# Altium footprint library LukaLIBRARY.PcbLib: 784 footprints (part 42 of 49)
Each footprint in its own frame and in the unit in brackets; x right, y up, seen from the top. Pads: shape width x height; smd on the part's side, far side on the other; paste and mask are expansions set on the pad; w line width, h text height; cw(c..) or ccw(c..) is an arc to the next point about the centre after c.
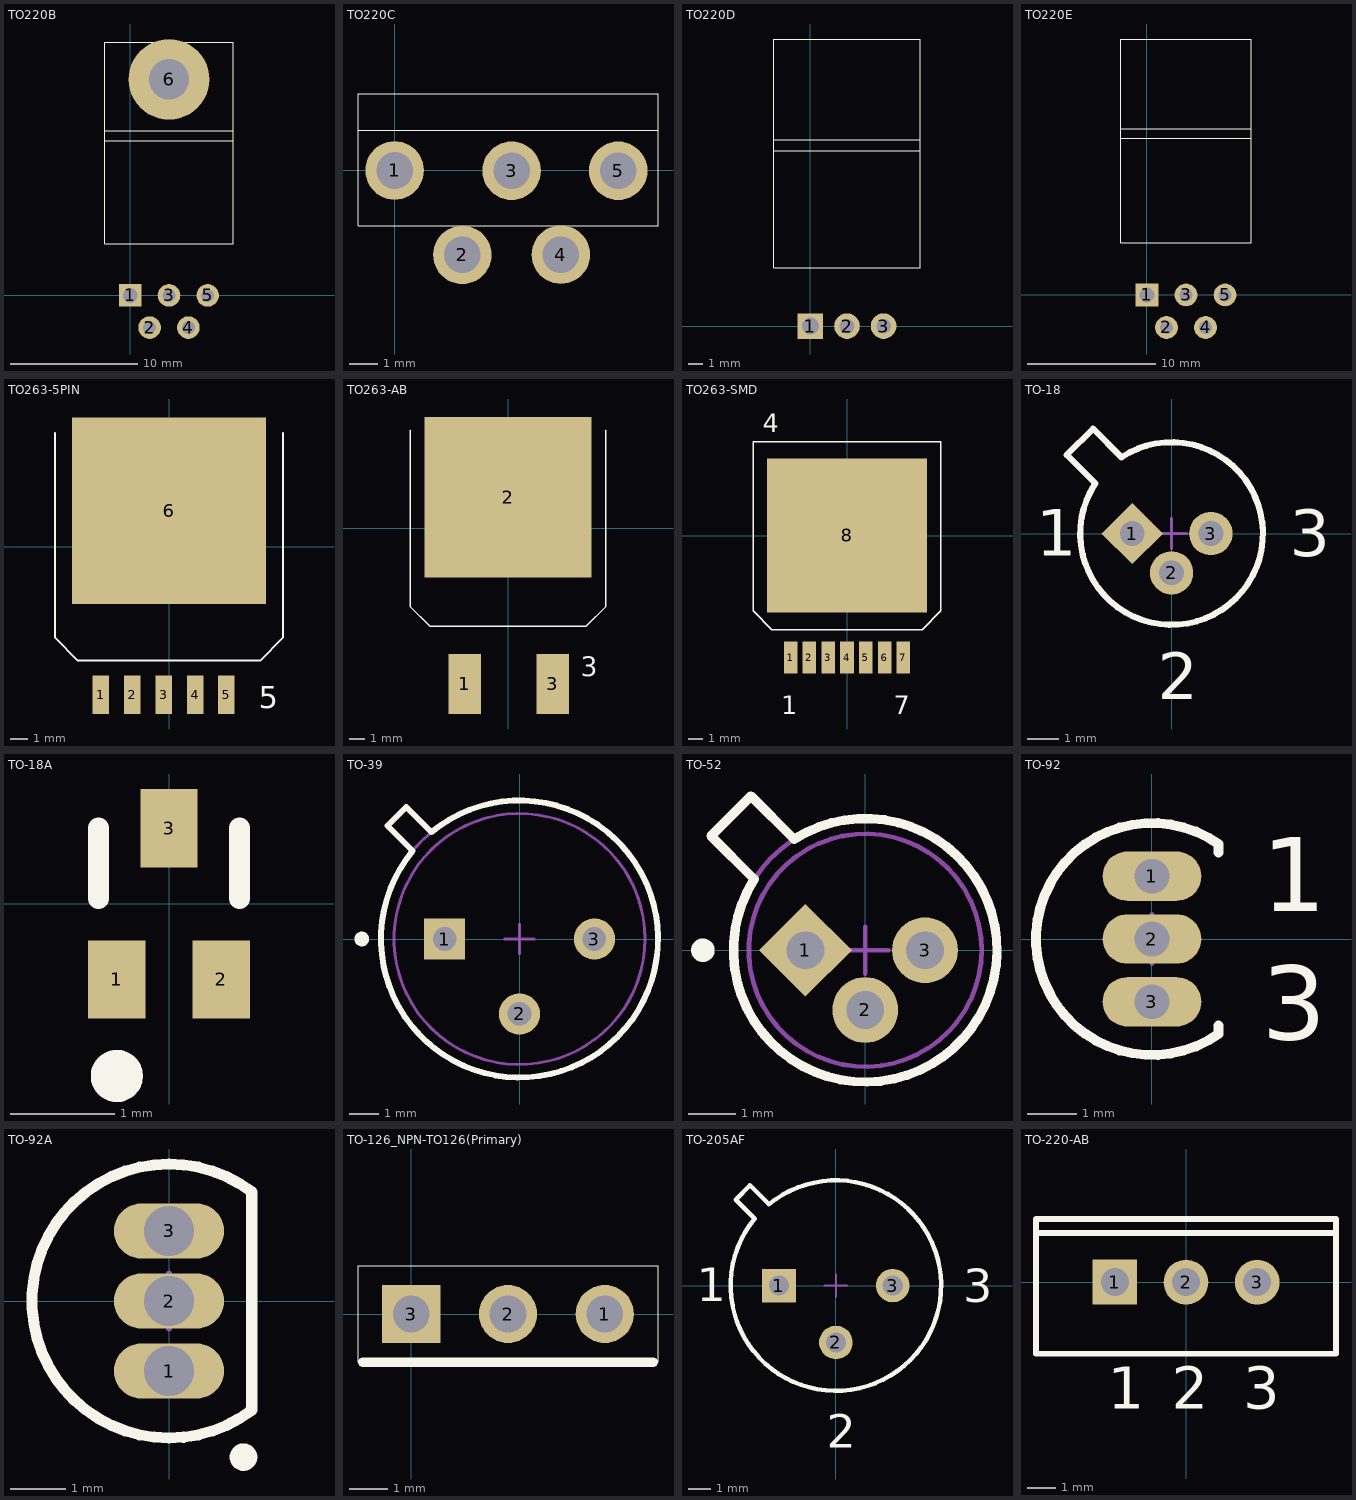
[diagram p41: the footprints below, top view; thin cyan lines are the x and y axes]

## TO220B [mil]
pads (6):
  rect 70x70 hole 46: 1(0,0)
  round 70 hole 40 mask-1000: 2(60,-100) 3(120,0) 4(180,-100) 5(240,0)
  round 250 hole 125: 6(120,670)
Top Overlay:
  lines w1: -80,480 320,480 ; -80,510 320,510 ; -80,160 -80,785 320,785 320,160 -80,160
Top Solder:
  region: 60,-64.7 50.86,-65.9 42.35,-69.43 35.04,-75.04 29.43,-82.35 25.9,-90.86 24.7,-100 25.9,-109.14 29.43,-117.65 35.04,-124.96 42.35,-130.57 50.86,-134.1 60,-135.3 69.14,-134.1 77.65,-130.57 84.96,-124.96 90.57,-117.65 94.1,-109.14 95.3,-100 94.1,-90.86 90.57,-82.35 84.96,-75.04 77.65,-69.43 69.14,-65.9
  region: 180,-64.7 170.86,-65.9 162.35,-69.43 155.04,-75.04 149.43,-82.35 145.9,-90.86 144.7,-100 145.9,-109.14 149.43,-117.65 155.04,-124.96 162.35,-130.57 170.86,-134.1 180,-135.3 189.14,-134.1 197.65,-130.57 204.96,-124.96 210.57,-117.65 214.1,-109.14 215.3,-100 214.1,-90.86 210.57,-82.35 204.96,-75.04 197.65,-69.43 189.14,-65.9
  region: 240,35.3 230.86,34.1 222.35,30.57 215.04,24.96 209.43,17.65 205.9,9.14 204.7,0 205.9,-9.14 209.43,-17.65 215.04,-24.96 222.35,-30.57 230.86,-34.1 240,-35.3 249.14,-34.1 257.65,-30.57 264.96,-24.96 270.57,-17.65 274.1,-9.14 275.3,0 274.1,9.14 270.57,17.65 264.96,24.96 257.65,30.57 249.14,34.1
  region: 120,35.3 110.86,34.1 102.35,30.57 95.04,24.96 89.43,17.65 85.9,9.14 84.7,0 85.9,-9.14 89.43,-17.65 95.04,-24.96 102.35,-30.57 110.86,-34.1 120,-35.3 129.14,-34.1 137.65,-30.57 144.96,-24.96 150.57,-17.65 154.1,-9.14 155.3,0 154.1,9.14 150.57,17.65 144.96,24.96 137.65,30.57 129.14,34.1
Bottom Solder:
  region: 60,-64.7 50.86,-65.9 42.35,-69.43 35.04,-75.04 29.43,-82.35 25.9,-90.86 24.7,-100 25.9,-109.14 29.43,-117.65 35.04,-124.96 42.35,-130.57 50.86,-134.1 60,-135.3 69.14,-134.1 77.65,-130.57 84.96,-124.96 90.57,-117.65 94.1,-109.14 95.3,-100 94.1,-90.86 90.57,-82.35 84.96,-75.04 77.65,-69.43 69.14,-65.9
  region: 180,-64.7 170.86,-65.9 162.35,-69.43 155.04,-75.04 149.43,-82.35 145.9,-90.86 144.7,-100 145.9,-109.14 149.43,-117.65 155.04,-124.96 162.35,-130.57 170.86,-134.1 180,-135.3 189.14,-134.1 197.65,-130.57 204.96,-124.96 210.57,-117.65 214.1,-109.14 215.3,-100 214.1,-90.86 210.57,-82.35 204.96,-75.04 197.65,-69.43 189.14,-65.9
  region: 240,35.3 230.86,34.1 222.35,30.57 215.04,24.96 209.43,17.65 205.9,9.14 204.7,0 205.9,-9.14 209.43,-17.65 215.04,-24.96 222.35,-30.57 230.86,-34.1 240,-35.3 249.14,-34.1 257.65,-30.57 264.96,-24.96 270.57,-17.65 274.1,-9.14 275.3,0 274.1,9.14 270.57,17.65 264.96,24.96 257.65,30.57 249.14,34.1
  region: 120,35.3 110.86,34.1 102.35,30.57 95.04,24.96 89.43,17.65 85.9,9.14 84.7,0 85.9,-9.14 89.43,-17.65 95.04,-24.96 102.35,-30.57 110.86,-34.1 120,-35.3 129.14,-34.1 137.65,-30.57 144.96,-24.96 150.57,-17.65 154.1,-9.14 155.3,0 154.1,9.14 150.57,17.65 144.96,24.96 137.65,30.57 129.14,34.1

## TO220C [mil]
pads (5):
  round 80 hole 50: 1(0,-0.39) 2(92.52,-115.75) 3(159.76,-0.79) 4(227.17,-115.35) 5(305.51,-0.79)
Top Overlay:
  lines w1: -50,54.33 359.76,54.21 ; -50,-75.98 -50,104.33 359.76,104.21 359.76,-75.79 -50,-75.98

## TO220D [mil]
pads (3):
  rect 70x70 hole 46: 1(0,0)
  round 70 hole 40 mask-1000: 2(100,0) 3(200,0)
Top Overlay:
  lines w1: -100,480 300,480 ; -100,510 300,510 ; -100,160 -100,785 300,785 300,160 -100,160
Top Solder:
  region: 200,35.3 190.86,34.1 182.35,30.57 175.04,24.96 169.43,17.65 165.9,9.14 164.7,0 165.9,-9.14 169.43,-17.65 175.04,-24.96 182.35,-30.57 190.86,-34.1 200,-35.3 209.14,-34.1 217.65,-30.57 224.96,-24.96 230.57,-17.65 234.1,-9.14 235.3,0 234.1,9.14 230.57,17.65 224.96,24.96 217.65,30.57 209.14,34.1
  region: 100,35.3 90.86,34.1 82.35,30.57 75.04,24.96 69.43,17.65 65.9,9.14 64.7,0 65.9,-9.14 69.43,-17.65 75.04,-24.96 82.35,-30.57 90.86,-34.1 100,-35.3 109.14,-34.1 117.65,-30.57 124.96,-24.96 130.57,-17.65 134.1,-9.14 135.3,0 134.1,9.14 130.57,17.65 124.96,24.96 117.65,30.57 109.14,34.1
Bottom Solder:
  region: 200,35.3 190.86,34.1 182.35,30.57 175.04,24.96 169.43,17.65 165.9,9.14 164.7,0 165.9,-9.14 169.43,-17.65 175.04,-24.96 182.35,-30.57 190.86,-34.1 200,-35.3 209.14,-34.1 217.65,-30.57 224.96,-24.96 230.57,-17.65 234.1,-9.14 235.3,0 234.1,9.14 230.57,17.65 224.96,24.96 217.65,30.57 209.14,34.1
  region: 100,35.3 90.86,34.1 82.35,30.57 75.04,24.96 69.43,17.65 65.9,9.14 64.7,0 65.9,-9.14 69.43,-17.65 75.04,-24.96 82.35,-30.57 90.86,-34.1 100,-35.3 109.14,-34.1 117.65,-30.57 124.96,-24.96 130.57,-17.65 134.1,-9.14 135.3,0 134.1,9.14 130.57,17.65 124.96,24.96 117.65,30.57 109.14,34.1

## TO220E [mil]
pads (5):
  rect 70x70 hole 46: 1(0,0)
  round 70 hole 40 mask-1000: 2(60,-100) 3(120,0) 4(180,-100) 5(240,0)
Top Overlay:
  lines w1: -80,480 320,480 ; -80,510 320,510 ; -80,160 -80,785 320,785 320,160 -80,160
Top Solder:
  region: 60,-64.7 50.86,-65.9 42.35,-69.43 35.04,-75.04 29.43,-82.35 25.9,-90.86 24.7,-100 25.9,-109.14 29.43,-117.65 35.04,-124.96 42.35,-130.57 50.86,-134.1 60,-135.3 69.14,-134.1 77.65,-130.57 84.96,-124.96 90.57,-117.65 94.1,-109.14 95.3,-100 94.1,-90.86 90.57,-82.35 84.96,-75.04 77.65,-69.43 69.14,-65.9
  region: 120,35.3 110.86,34.1 102.35,30.57 95.04,24.96 89.43,17.65 85.9,9.14 84.7,0 85.9,-9.14 89.43,-17.65 95.04,-24.96 102.35,-30.57 110.86,-34.1 120,-35.3 129.14,-34.1 137.65,-30.57 144.96,-24.96 150.57,-17.65 154.1,-9.14 155.3,0 154.1,9.14 150.57,17.65 144.96,24.96 137.65,30.57 129.14,34.1
  region: 180,-64.7 170.86,-65.9 162.35,-69.43 155.04,-75.04 149.43,-82.35 145.9,-90.86 144.7,-100 145.9,-109.14 149.43,-117.65 155.04,-124.96 162.35,-130.57 170.86,-134.1 180,-135.3 189.14,-134.1 197.65,-130.57 204.96,-124.96 210.57,-117.65 214.1,-109.14 215.3,-100 214.1,-90.86 210.57,-82.35 204.96,-75.04 197.65,-69.43 189.14,-65.9
  region: 240,35.3 230.86,34.1 222.35,30.57 215.04,24.96 209.43,17.65 205.9,9.14 204.7,0 205.9,-9.14 209.43,-17.65 215.04,-24.96 222.35,-30.57 230.86,-34.1 240,-35.3 249.14,-34.1 257.65,-30.57 264.96,-24.96 270.57,-17.65 274.1,-9.14 275.3,0 274.1,9.14 270.57,17.65 264.96,24.96 257.65,30.57 249.14,34.1
Bottom Solder:
  region: 60,-64.7 50.86,-65.9 42.35,-69.43 35.04,-75.04 29.43,-82.35 25.9,-90.86 24.7,-100 25.9,-109.14 29.43,-117.65 35.04,-124.96 42.35,-130.57 50.86,-134.1 60,-135.3 69.14,-134.1 77.65,-130.57 84.96,-124.96 90.57,-117.65 94.1,-109.14 95.3,-100 94.1,-90.86 90.57,-82.35 84.96,-75.04 77.65,-69.43 69.14,-65.9
  region: 120,35.3 110.86,34.1 102.35,30.57 95.04,24.96 89.43,17.65 85.9,9.14 84.7,0 85.9,-9.14 89.43,-17.65 95.04,-24.96 102.35,-30.57 110.86,-34.1 120,-35.3 129.14,-34.1 137.65,-30.57 144.96,-24.96 150.57,-17.65 154.1,-9.14 155.3,0 154.1,9.14 150.57,17.65 144.96,24.96 137.65,30.57 129.14,34.1
  region: 180,-64.7 170.86,-65.9 162.35,-69.43 155.04,-75.04 149.43,-82.35 145.9,-90.86 144.7,-100 145.9,-109.14 149.43,-117.65 155.04,-124.96 162.35,-130.57 170.86,-134.1 180,-135.3 189.14,-134.1 197.65,-130.57 204.96,-124.96 210.57,-117.65 214.1,-109.14 215.3,-100 214.1,-90.86 210.57,-82.35 204.96,-75.04 197.65,-69.43 189.14,-65.9
  region: 240,35.3 230.86,34.1 222.35,30.57 215.04,24.96 209.43,17.65 205.9,9.14 204.7,0 205.9,-9.14 209.43,-17.65 215.04,-24.96 222.35,-30.57 230.86,-34.1 240,-35.3 249.14,-34.1 257.65,-30.57 264.96,-24.96 270.57,-17.65 274.1,-9.14 275.3,0 274.1,9.14 270.57,17.65 264.96,24.96 257.65,30.57 249.14,34.1

## TO263-5PIN [mm]
pads (6):
  rect 0.914x2.159 smd mask-25.4: 1(-3.8,-8.25) 2(-2.04,-8.25) 3(-0.3,-8.25) 4(1.46,-8.25) 5(3.2,-8.25)
  rect 10.795x10.414 smd mask-25.4: 6(0,2)
Top Overlay:
  lines w0.1: -6.35,6.35 -6.35,-5.08 -5.08,-6.35 5.08,-6.35 6.35,-5.08 6.35,6.35
  text "5" at 5,-9 h1.25
Top Solder:
  region: -5.397,-3.207 5.397,-3.207 5.397,7.207 -5.397,7.207
  region: -0.757,-9.329 0.157,-9.329 0.157,-7.17 -0.757,-7.17
  region: 2.743,-9.329 3.657,-9.329 3.657,-7.17 2.743,-7.17
  region: 1.003,-9.329 1.917,-9.329 1.917,-7.17 1.003,-7.17
  region: -2.497,-9.329 -1.583,-9.329 -1.583,-7.17 -2.497,-7.17
  region: -4.257,-9.329 -3.343,-9.329 -3.343,-7.17 -4.257,-7.17

## TO263-AB [mm]
pads (3):
  rect 2.1x3.9 smd: 1(-2.8,-10.1) 3(2.9,-10.1)
  rect 10.795x10.414 smd mask-25.4: 2(0,2)
Top Overlay:
  lines w0.1: -6.35,6.35 -6.35,-5.08 -5.08,-6.35 5.08,-6.35 6.35,-5.08 6.35,6.35
  text "3" at 4.7,-9.6 h1.25
Top Solder:
  region: -5.397,-3.207 5.397,-3.207 5.397,7.207 -5.397,7.207

## TO263-SMD [mil]
pads (8):
  rect 36x85 smd mask-1000: 1(-150,-325) 2(-100,-325) 3(-50,-325) 4(0,-325) 5(50,-325) 6(100,-325) 7(150,-325)
  rect 425x410 smd mask-1000: 8(0,1)
Top Overlay:
  lines w3.94: -250,-200 -250,250 250,250 250,-200 200,-250 -200,-250 -250,-200
  text "7" at 125,-475 h49.21
  text "1" at -175,-475 h49.21
  text "4" at -225,275 h49.21
Top Solder:
  region: -212.5,-204 212.5,-204 212.5,206 -212.5,206
  region: 132,-367.5 168,-367.5 168,-282.5 132,-282.5
  region: -168,-367.5 -132,-367.5 -132,-282.5 -168,-282.5
  region: 82,-367.5 118,-367.5 118,-282.5 82,-282.5
  region: 32,-367.5 68,-367.5 68,-282.5 32,-282.5
  region: -18,-367.5 18,-367.5 18,-282.5 -18,-282.5
  region: -68,-367.5 -32,-367.5 -32,-282.5 -68,-282.5
  region: -118,-367.5 -82,-367.5 -82,-282.5 -118,-282.5

## TO-18 [mm] "Can; 3 Leads; Pin Circle Dia. 2.54 mm; Lead Dia. 0.48 mm (max)"
height 5.33
pads (3):
  rect 1.4x1.4 hole 0.8 rot 45: 1(-1.27,0)
  round 1.4 hole 0.8: 2(0,-1.27) 3(1.27,0)
Top Overlay:
  lines w0.2: -3.386,2.537 -2.537,3.386 -1.618,2.467 cw(c0,0) -2.467,1.618 -3.386,2.537
  text "1" at -4.38,-0.719 h1.5
  text "2" at -0.443,-5.355 h1.5
  text "3" at 3.812,-0.742 h1.5
Mechanical 15:
  lines w0.1: -0.5,0 0.5,0 ; 0,-0.5 0,0.5

## TO-18A [mm] "SC-89; 3 Flat Leads; Body 1.6 x 1.6 x 0.7 mm, inc leads (LxWxH typ)"
height 0.8
pads (3):
  rect 0.55x0.75 smd: 1(-0.5,-0.725) 2(0.5,-0.725) 3(0,0.725)
Top Overlay:
  circle w0.25: c-0.5,-1.65 r0.125
  lines w0.2: -0.676,0.05 -0.676,0.725 ; 0.675,0.05 0.675,0.725

## TO-39 [mm] "Can; 3 Leads; Pin Circle Dia. 5.08 mm; Lead Dia. 0.48 mm (max)"
height 4.55
pads (3):
  rect 1.4x1.4 hole 0.8: 1(-2.54,0)
  round 1.4 hole 0.8: 2(0,-2.54) 3(2.54,0)
Top Overlay:
  circle w0.25: c-5.35,0 r0.125
  lines w0.2: -3.626,2.99 -4.475,3.838 -3.838,4.475 -2.99,3.626 ; -3.622,2.987 ccw(c0,0) -2.987,3.622
Mechanical 13:
  circle w0.1: c0,0 r4.695
  circle w0.1: c0,0 r4.255
Mechanical 15:
  lines w0.1: -0.5,0 0.5,0 ; 0,-0.5 0,0.5
3D body: height 1.27, standoff 0, extent -4.705,-4.705 4.705,4.705
3D body: height 4.55, standoff 1.27, extent -4.264,-4.264 4.264,4.264

## TO-52 [mm] "Can; 3 Leads; Pin Circle Dia. 2.54 mm; Lead Dia. 0.48 mm (max)"
height 2.67
pads (3):
  rect 1.4x1.4 hole 0.8 rot 45: 1(-1.27,0)
  round 1.4 hole 0.8: 2(0,-1.27) 3(1.27,0)
Top Overlay:
  circle w0.25: c-3.45,0 r0.125
  lines w0.2: -3.277,2.429 -2.429,3.277 -1.51,2.358 cw(c0,0) -2.358,1.51 -3.277,2.429
Mechanical 13:
  circle w0.1: c0,0 r2.475
  circle w0.1: c0,0 r2.8
Mechanical 15:
  lines w0.1: -0.5,0 0.5,0 ; 0,-0.5 0,0.5
3D body: height 2.67, standoff 0.76, extent -2.486,-2.486 2.486,2.486
3D body: height 0.76, standoff 0, extent -2.808,-2.808 2.808,2.808

## TO-92 [mm] "TO, Flat Index; 3 In-Line, Axial Leads; Body Dia. 4.6mm; Leads 0.41 x 0.39 mm (max)"
height 4.7
pads (3):
  oval 2x1 hole 0.7: 1(0,1.27) 2(0,0) 3(0,-1.27)
Top Overlay:
  lines w0.2: 1.35,-1.75 1.35,-1.92 cw(c0,0) 1.35,1.92 1.35,1.75
  text "3" at 2.224,-2.035 h1.5
  text "1" at 2.224,0.56 h1.5
Mechanical 15:
  lines w0.1: -0.5,0 0.5,0 ; 0,-0.5 0,0.5

## TO-92A [mm] "TO, Flat Index; 3 In-Line, Axial Leads; Body Dia. 4.5mm; Leads 0.51 x 0.48 mm (max)"
height 6.86
pads (3):
  oval 2x1 hole 0.9: 1(0,-1.27) 2(0,0) 3(0,1.27)
Top Overlay:
  circle w0.25: c1.35,-2.83 r0.125
  lines w0.2: 1.5,-1.98 cw(c0,0) 1.5,1.98 1.5,-1.98
Mechanical 13:
  lines w0.1: 1.5,-1.98 cw(c0,0) 1.5,1.98 1.5,-1.98
Mechanical 15:
  lines w0.1: -0.5,0 0.5,0 ; 0,-0.5 0,0.5
3D body: height 6.86, standoff 2.2, extent -2.497,-2.497 1.501,2.497

## TO-126_NPN-TO126(Primary) [mil]
pads (3):
  round 60 hole 38 mask-1000: 1(200,0) 2(100,0)
  rect 60x60 hole 38 mask-1000: 3(0,0)
Top Overlay:
  lines w1: -55,-50 -55,50 255,50 255,-50
  lines w10: -50,-50 250,-50
Top Solder:
  region: -30,-30 30,-30 30,30 -30,30
  region: 200,30.26 192.17,29.23 184.87,26.2 178.6,21.4 173.79,15.13 170.77,7.83 169.74,0 170.77,-7.83 173.79,-15.13 178.6,-21.4 184.87,-26.2 192.17,-29.23 200,-30.26 207.83,-29.23 215.13,-26.2 221.4,-21.4 226.21,-15.13 229.23,-7.83 230.26,0 229.23,7.83 226.21,15.13 221.4,21.4 215.13,26.2 207.83,29.23
  region: 100,30.26 92.17,29.23 84.87,26.2 78.6,21.4 73.8,15.13 70.77,7.83 69.74,0 70.77,-7.83 73.8,-15.13 78.6,-21.4 84.87,-26.2 92.17,-29.23 100,-30.26 107.83,-29.23 115.13,-26.2 121.4,-21.4 126.2,-15.13 129.23,-7.83 130.26,0 129.23,7.83 126.2,15.13 121.4,21.4 115.13,26.2 107.83,29.23
Bottom Solder:
  region: -30,-30 30,-30 30,30 -30,30
  region: 200,30.26 192.17,29.23 184.87,26.2 178.6,21.4 173.79,15.13 170.77,7.83 169.74,0 170.77,-7.83 173.79,-15.13 178.6,-21.4 184.87,-26.2 192.17,-29.23 200,-30.26 207.83,-29.23 215.13,-26.2 221.4,-21.4 226.21,-15.13 229.23,-7.83 230.26,0 229.23,7.83 226.21,15.13 221.4,21.4 215.13,26.2 207.83,29.23
  region: 100,30.26 92.17,29.23 84.87,26.2 78.6,21.4 73.8,15.13 70.77,7.83 69.74,0 70.77,-7.83 73.8,-15.13 78.6,-21.4 84.87,-26.2 92.17,-29.23 100,-30.26 107.83,-29.23 115.13,-26.2 121.4,-21.4 126.2,-15.13 129.23,-7.83 130.26,0 129.23,7.83 126.2,15.13 121.4,21.4 115.13,26.2 107.83,29.23

## TO-205AF [mm] "Can; 3 Leads; Pin Circle Dia. 5.08 mm; Lead Dia. 0.53 mm (max)"
height 4.57
pads (3):
  rect 1.5x1.5 hole 0.9: 1(-2.54,0)
  round 1.5 hole 0.9: 2(0,-2.54) 3(2.54,0)
Top Overlay:
  lines w0.2: -4.475,3.838 -3.838,4.475 -2.99,3.626 cw(c0,0) -3.626,2.99 -4.475,3.838
  text "3" at 5.694,-0.751 h1.5
  text "2" at -0.415,-7.238 h1.5
  text "1" at -6.201,-0.697 h1.5
Mechanical 15:
  lines w0.1: -0.5,0 0.5,0 ; 0,-0.5 0,0.5

## TO-220-AB [mm] "TO, Thru-Hole, Vertical, Heatsink Mounted; 3 In-Line Leads; Pitch 2.54 mm"
height 19.1
pads (3):
  rect 1.6x1.6 hole 1: 1(-2.54,0)
  round 1.6 hole 1: 2(0,0) 3(2.54,0)
Top Overlay:
  lines w0.2: -5.35,1.75 5.35,1.75 ; -5.35,-2.55 -5.35,2.25 5.35,2.25 5.35,-2.55 -5.35,-2.55
  text "3" at 2.04,-4.525 h1.5
  text "2" at -0.5,-4.525 h1.5
  text "1" at -2.79,-4.525 h1.5